# Altium integrated library USD Parts.IntLib: 139 symbols (part 1 of 3) (continued)
## AD9245BCPZ-80 (continued)
DIFF 14-Bit ADC; MPN: AD9245BCPZ-80; OC_FARNELL: 2096172; OC_NEWARK: 59K7235; PACKAGE: QFN-32; SUPPLIER: ANALOG DEVICES; Supplier 1: Digi-Key; Supplier Part Number 1: AD9245BCPZ-80-ND
footprint LFCSP-32 (32-Lead Frame Chip Scale Package 5x5 mm Body)
pins: 1 DNC, 2 CLK, 3 DNC_2, 4 PDWN, 5 (LSB)D0 (out), 6 D1 (out), 7 D2 (out), 8 D3 (out), 9 D4 (out), 10 D5 (out), 11 D6 (out), 12 D7 (out), 13 D8 (out), 14 D9 (out), 15 DGND, 16 DRVDD (power), 17 D10 (out), 18 D11 (out), 19 D12 (out), 20 D13(MSB) (out), 21 OTR, 22 MODE, 23 SENSE, 24 VREF, 25 REFB, 26 REFT, 27 AVDD_2 (power), 28 AGND_2, 29 VIN+, 30 VIN-, 31 AGND, 32 AVDD (power), 33 EPAD

## ADP151
designator U?, comment ADP151AUJZ-3.3-R7  Supplier Part Number 1: 2074871
LDO; value: ADP151AUJZ-3.3-R7; Supplier 1: Farnell; DataSheet: http://www.analog.com/media/en/technical-documentation/data-sheets/ADP151.pdf
footprint SOT23-5-TI (TPS730xx power)
pins: 1 IN (power), 2 GND (power), 3 EN (power), 4 NC (power), 5 OUT (power)

## ADP7104
designator U?, comment ADP7104ARDZ-3.3-R7  Supplier Part Number 1: ADP7104ARDZ-3.3-R7CT-ND
LDO; value: ADP7104ARDZ-3.3-R7; Supplier 1: Digi-Key; DataSheet: http://www.analog.com/media/en/technical-documentation/data-sheets/ADP7104.pdf
footprint SOIC8_EP (SOIC, 8-Leads, Body 4,90x3,90mm, Pitch 1,27mm, Thermal Pad 3,10x2,42mm, IPC Medium Density)
pins: 1 VOUT (power), 2 SENSE (power), 3 GND (power), 4 NC (power), 5 EN/UVLO (power), 6 GND (power), 7 PG (power), 8 VIN (power)

## AQY282S
designator Q?  Supplier Part Number 1: 2396110
PhotoMOS RELAY 0.5A, 60V; value: AQY282S; ComponentLink1URL: http://www.farnell.com/datasheets/1486501.pdf; Supplier 1: Farnell; ComponentLink1Description: Datasheet
footprint SOP4 (AQY28_S)
pins: 1 VDD (power), 2 GND (power), 3 IO2 (io), 4 IO1 (io)

## B3S-1000
designator D?  Supplier Part Number 1: 177807
Sealed Tactile Switch (SMT); value: B3S-1000; Supplier 1: Farnell
footprint Omron B3S1000 (SMT)
pins: 1, 2, 3, 4

## BAT64-04
designator D?  Supplier Part Number 1: 2432680
Silicon Schottky Diodes; value: BAT64-04; Supplier 1: Farnell
simulation model BAT64 (Model Description)
footprint SOT23-3
pins: 1 A1, 2 C2, 3 C1A2

## BAT64-05
designator D?
Silicon Schottky Diodes; value: BAT64-05
footprint SOT23-3
pins: 1 A1, 2 A2, 3 C

## BAT64-06
designator D?
Silicon Schottky Diodes; value: BAT64-06
footprint SOT23-3
pins: 1 K1, 2 K2, 3 AA

## BZX84-
designator D?  Supplier Part Number 1: 1902449
Zener Diode; Published: 8-Jun-2000; LatestRevisionDate: 17-Jul-2002; LatestRevisionNote: Re-released for DXP Platform.; PackageReference: DIODE-0.7; Publisher: Altium Limited; PackageDescription: Diode, Thru-Hole; 2 Leads; 0.7 in Pin Spacing; Supplier 1: Farnell; value: BZX84-
signal-integrity model D Zener
footprint SOT23-3; pin to pad 2>3
pins: 1 A, 2 K

## Capacitor
designator C?, comment 10µF
Capacitor; value: 10µF
footprint 1812
footprint Panasonic Size B (Aluminum Electrolytic Capacitor, Body 4,30x4,30x5,50mm, IPC Low Density)
footprint Panasonic Size C (Aluminum Electrolytic Capacitor, Body 5,30x5,30x5,50mm, IPC Low Density)
footprint Panasonic Size D (Aluminum Electrolytic Capacitor, Body 6,60x6,60x5,50mm, IPC Low Density)
footprint Panasonic Size E (Aluminum Electrolytic Capacitor, Body 8,30x8,30x6,50mm, IPC Low Density)
footprint 0402[1005]
footprint 0504[1210]
footprint 0603[1508]
footprint 0805[2012]
footprint 1206[3216]
pins: 1 P$1, 2 P$2

## CMP-0001-00027-1
designator MH1, comment Mounting-Hole-Altium  (no BOM)
Mounting Hole, Altium, 3.8mm pad, 3.4mm plated hole; ClassName: Mounting Hole; Publisher: Altium
footprint Mounting-Hole-Altium (Mounting Hole, Altium, 3.8mm pad, 3.4mm plated hole)
pins: 1 hidden

## Crystal 2PIN
designator OSC?
Resonator
footprint CC7V
footprint CRYSTAL_HC49-US-SM (SMD Crystal HC49/US-SM package)
footprint CRYSTAL_CMR309T (SMD Crystal CMR309T package)
pins: 1, 2

## Crystal 3PIN
designator OSC?
Resonator
footprint PRQC-TYP
pins: 1, 2, 3 (out)

## Crystal 4PIN
designator OSC?
Resonator
footprint 3.2X.2.5
footprint CRYSTAL_4-LCC (SMD Crystal 4-lead leadless package)
footprint CRYSTAL_NX2520SA (SMD Crystal 4-lead leadless package)
pins: CLK (out), EN (in), GND (power), VCC (power)

## DP83848J
designator IC?, comment DP83848J PHYTER Mini LS Single Port 10/100 Ethernet Transceiver  Supplier Part Number 1: DP83848JSQ/NOPBDKR-ND
National Semiconductor Ethernet PHY; Supplier 1: Digi-Key
footprint LLP-40
pins: 1 IOVDD33 (power), 2 TX_CLK (out), 3 TX_EN, 4 TXD_0, 5 TXD_1, 6 TXD_2, 7 TXD_3, 8 RESERVED, 9 RESERVED, 10 RESERVED, 11 RD-, 12 RD+, 13 AGND (power), 14 TD-, 15 TD+, 16 PFBIN1, 17 AGND (power), 18 AVDD33 (power), 19 PFBOUT, 20 RBIAS, 21 LED_SPEED/AN1 (out), 22 LED_LINK/AN0 (out), 23 RESET_N, 24 MDIO, 25 MDC, 26 IOVDD33 (power), 27 X2, 28 X1, 29 DGND (power), 30 PFBIN2, 31 RX_CLK (out), 32 RX_DV/MII_MODE (out), 33 CRS/CRS_DV/LED_CFG (out), 34 RX_ER/MDIX_EN (out), 35 COL/PHYAD0 (out), 36 RXD_0/PHYAD1 (out), 37 RXD_1/PHYAD2 (out), 38 RXD_2/PHYAD3 (out), 39 RXD_3/PHYAD4 (out), 40 IOGND (power), DAP GNDPAD (power)

## Inductor
designator L?, comment 10mH
Inductor; Code_IEC: 1005; Published: 8-Jun-2000; LatestRevisionDate: 29-May-2009; LatestRevisionNote: IPC-7351 Footprint Added.; PackageReference: 0402-A; Publisher: Altium Limited; PackageDescription: Chip Inductor; Code_JEITA: 0402; Value: 10mH
footprint INDC1608L (Chip Inductor, Body 1.6x0.8mm, IPC High Density)
footprint 2029 (Chip Inductor, Body 2.0x1.2mm, IPC High Density)
footprint INDC3216 (Chip Inductor, Body 3.2x1.6mm, IPC High Density)
footprint INDC4532 (Chip Inductor, Body 4.5x3.2mm, IPC High Density)
simulation model INDUCTOR (Inductor)
signal-integrity model Inductor
footprint 0603[1508]
footprint 0402[1005]
footprint WE0805
pins: 1, 2

## L78M
designator U?, comment Switch mode power supply
Resonator
footprint DPAK; pin to pad GND>4 VIN>1 VOUT>3
pins: GND (power), VIN (power), VOUT (power)

## LED
designator LED?, comment SMD LED
footprint CHIPLED_0603
footprint CHIPLED_0805
footprint CHIPLED_1206
pins: A, C

## LPC812M101FD20FP
designator U?, comment IC, 32-bit ARM Cortex-M0+ microcontroller 16 kB flash and 4 kB SRAM, SO20
MPN: LPC812M101FD20FP; OC_FARNELL: 2295531; OC_NEWARK: 69W0666; PACKAGE: SO20; SUPPLIER: NXP
footprint SOIC127P1032X265-20N
pins: 1 PIO0_17, 2 PIO0_13, 3 PIO0_12, 4 ~{RESET/PIO0_5}, 5 PIO0_4/WAKEUP, 6 SWCLK/PIO0_3, 7 SWDIO/PIO0_2/TMS, 8 PIO0_11, 9 PIO0_10, 10 PIO0_16, 11 PIO0_15, 12 PIO0_1/ACMP_I2, 13 PIO0_9/XTALOUT, 14 PIO0_8/XTALIN, 15 VDD (power), 16 VSS (power), 17 PIO0_7, 18 PIO0_6/VDDCMP, 19 PIO0_0/ACMP_I1, 20 PIO0_14

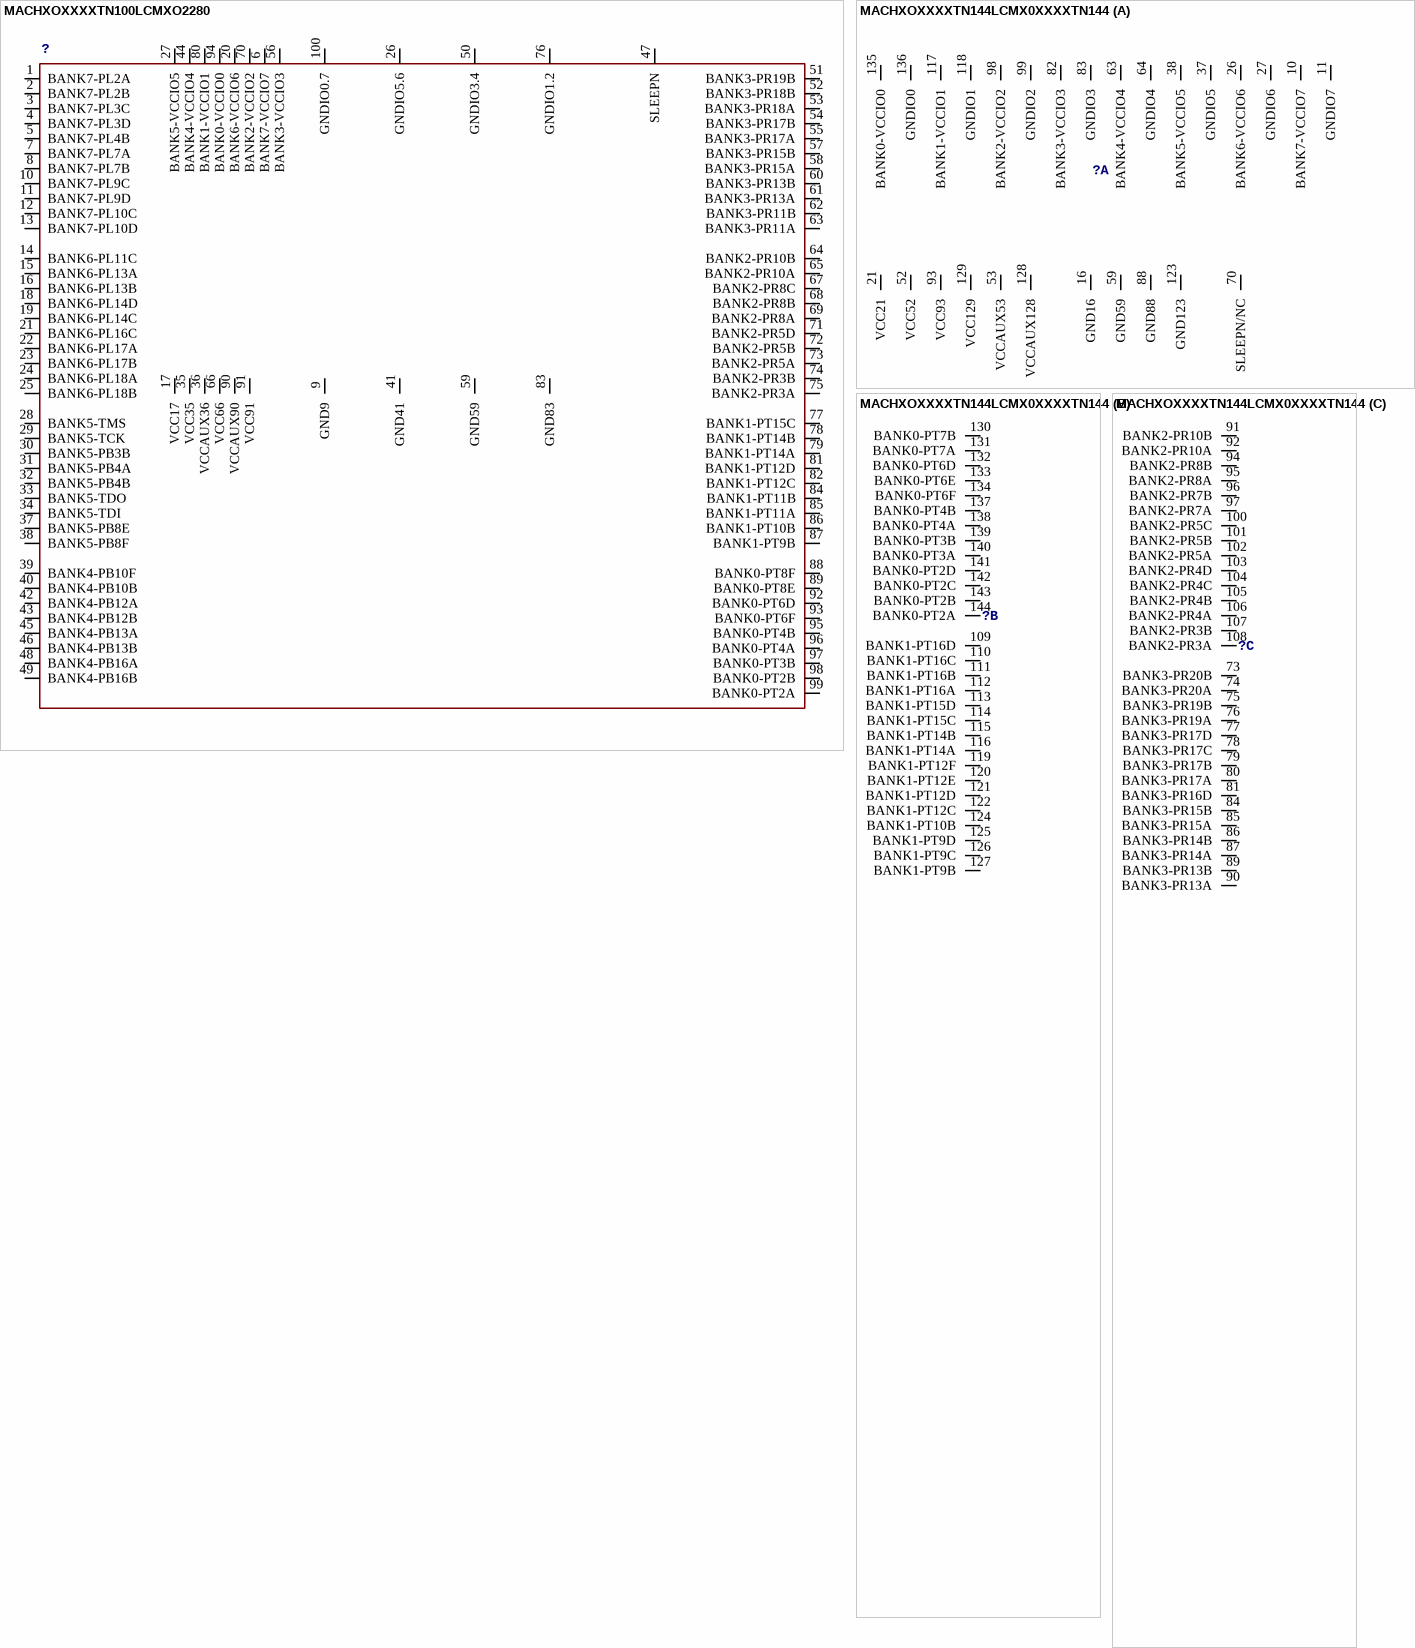
[diagram p3: symbols MACHXOXXXXTN100LCMXO2280 to MACHXOXXXXTN144LCMX0XXXXTN144]

## MACHXOXXXXTN100LCMXO2280
designator ?
footprint TQFP100
pins: 1 BANK7-PL2A, 2 BANK7-PL2B, 3 BANK7-PL3C, 4 BANK7-PL3D, 5 BANK7-PL4B, 6 BANK7-VCCIO7 (power), 7 BANK7-PL7A, 8 BANK7-PL7B, 9 GND9 (power), 10 BANK7-PL9C, 11 BANK7-PL9D, 12 BANK7-PL10C, 13 BANK7-PL10D, 14 BANK6-PL11C, 15 BANK6-PL13A, 16 BANK6-PL13B, 17 VCC17 (power), 18 BANK6-PL14D, 19 BANK6-PL14C, 20 BANK6-VCCIO6 (power), 21 BANK6-PL16C, 22 BANK6-PL17A, 23 BANK6-PL17B, 24 BANK6-PL18A, 25 BANK6-PL18B, 26 GNDIO5.6 (power), 27 BANK5-VCCIO5 (power), 28 BANK5-TMS, 29 BANK5-TCK, 30 BANK5-PB3B, 31 BANK5-PB4A, 32 BANK5-PB4B, 33 BANK5-TDO, 34 BANK5-TDI, 35 VCC35 (power), 36 VCCAUX36 (power), 37 BANK5-PB8E, 38 BANK5-PB8F, 39 BANK4-PB10F, 40 BANK4-PB10B, 41 GND41 (power), 42 BANK4-PB12A, 43 BANK4-PB12B, 44 BANK4-VCCIO4 (power), 45 BANK4-PB13A, 46 BANK4-PB13B, 47 SLEEPN, 48 BANK4-PB16A, 49 BANK4-PB16B, 50 GNDIO3.4 (power), 51 BANK3-PR19B, 52 BANK3-PR18B, 53 BANK3-PR18A, 54 BANK3-PR17B, 55 BANK3-PR17A, 56 BANK3-VCCIO3 (power), 57 BANK3-PR15B, 58 BANK3-PR15A, 59 GND59 (power), 60 BANK3-PR13B, 61 BANK3-PR13A, 62 BANK3-PR11B, 63 BANK3-PR11A, 64 BANK2-PR10B, 65 BANK2-PR10A, 66 VCC66 (power), 67 BANK2-PR8C, 68 BANK2-PR8B, 69 BANK2-PR8A, 70 BANK2-VCCIO2 (power), 71 BANK2-PR5D, 72 BANK2-PR5B, 73 BANK2-PR5A, 74 BANK2-PR3B, 75 BANK2-PR3A, 76 GNDIO1.2 (power), 77 BANK1-PT15C, 78 BANK1-PT14B, 79 BANK1-PT14A, 80 BANK1-VCCIO1 (power), 81 BANK1-PT12D, 82 BANK1-PT12C, 83 GND83 (power), 84 BANK1-PT11B, 85 BANK1-PT11A, 86 BANK1-PT10B, 87 BANK1-PT9B, 88 BANK0-PT8F, 89 BANK0-PT8E, 90 VCCAUX90 (power), 91 VCC91 (power), 92 BANK0-PT6D, 93 BANK0-PT6F, 94 BANK0-VCCIO0 (power), 95 BANK0-PT4B, 96 BANK0-PT4A, 97 BANK0-PT3B, 98 BANK0-PT2B, 99 BANK0-PT2A, 100 GNDIO0.7 (power)

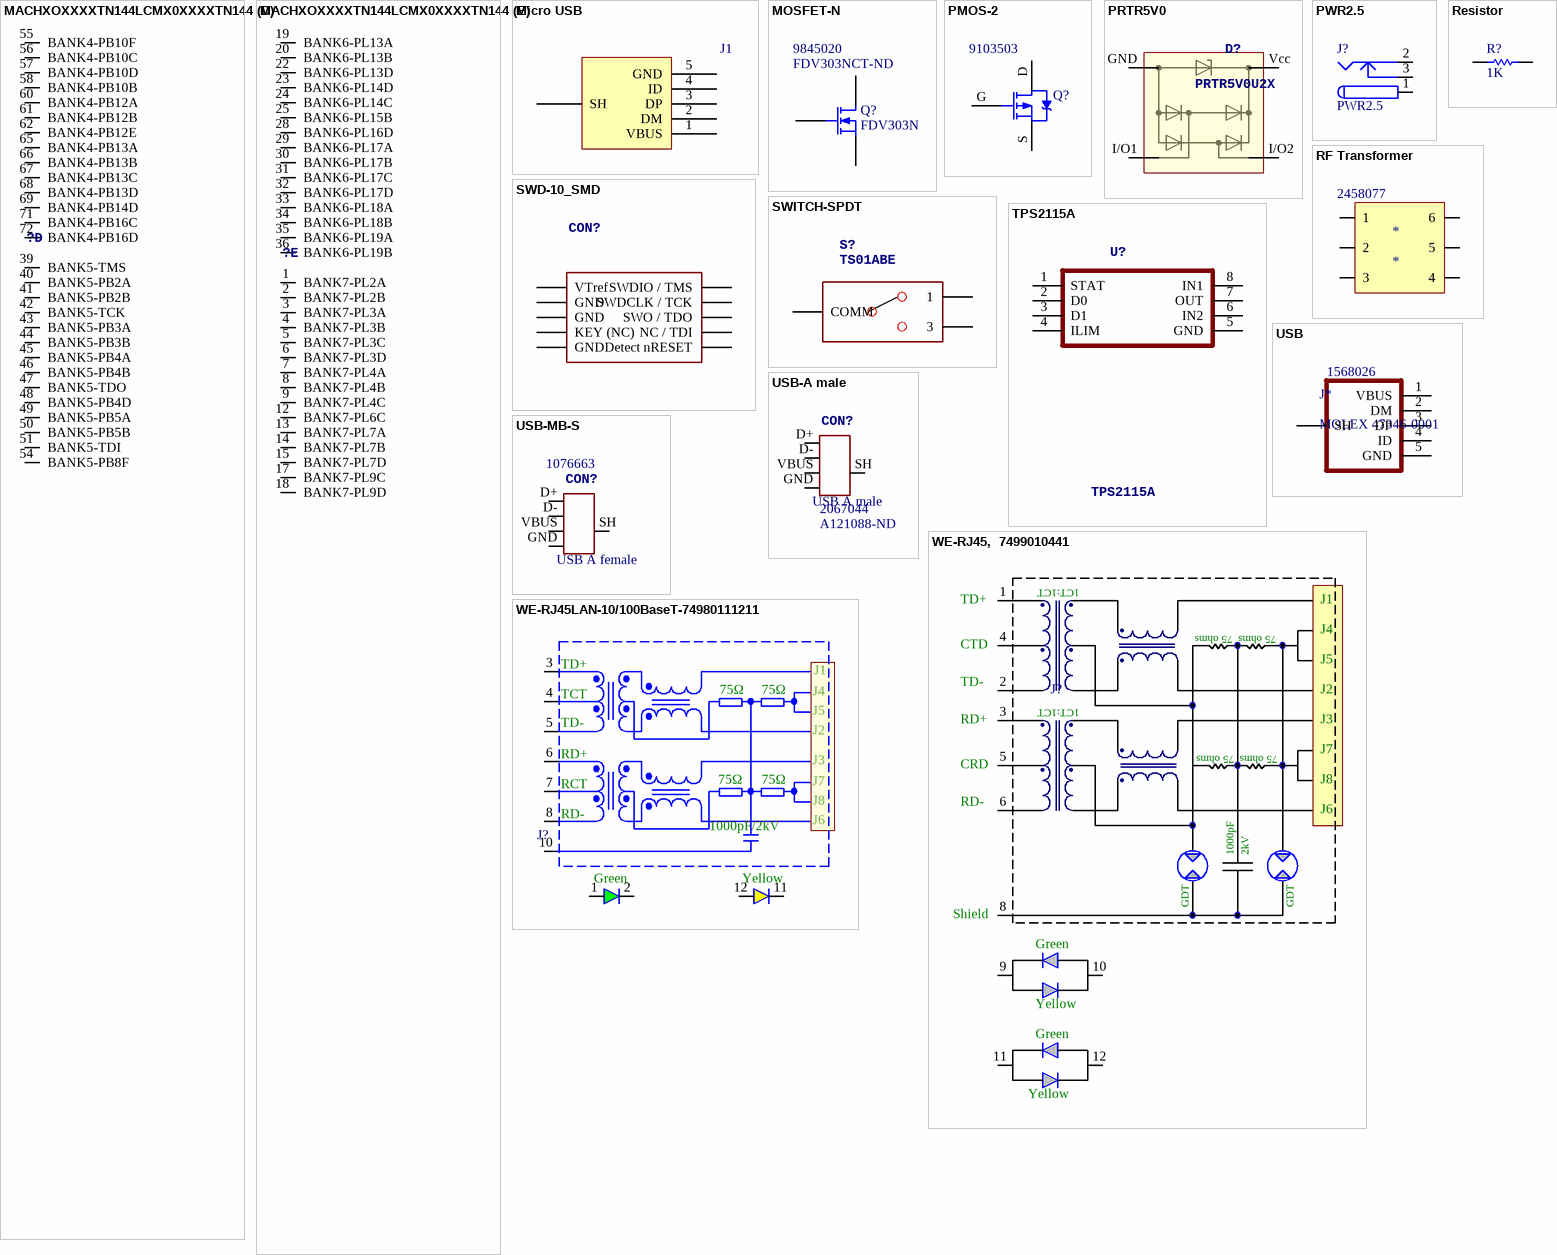
[diagram p4: symbols MACHXOXXXXTN144LCMX0XXXXTN144 to WE-RJ45LAN-10/100BaseT-74980111211]

## MACHXOXXXXTN144LCMX0XXXXTN144
designator ?
footprint TQFP144
footprint LQFP144 (plastic low profile quad flat package, 144 leads, body 20x20x1.4mm)
part A pins: 10 BANK7-VCCIO7 (power), 11 GNDIO7 (power), 16 GND16 (power), 21 VCC21 (power), 26 BANK6-VCCIO6 (power), 27 GNDIO6 (power), 37 GNDIO5 (power), 38 BANK5-VCCIO5 (power), 52 VCC52 (power), 53 VCCAUX53 (power), 59 GND59 (power), 63 BANK4-VCCIO4 (power), 64 GNDIO4 (power), 70 SLEEPN/NC, 82 BANK3-VCCIO3 (power), 83 GNDIO3 (power), 88 GND88 (power), 93 VCC93 (power), 98 BANK2-VCCIO2 (power), 99 GNDIO2 (power), 117 BANK1-VCCIO1 (power), 118 GNDIO1 (power), 123 GND123 (power), 128 VCCAUX128 (power), 129 VCC129 (power), 135 BANK0-VCCIO0 (power), 136 GNDIO0 (power)
part B pins: 109 BANK1-PT16D, 110 BANK1-PT16C, 111 BANK1-PT16B, 112 BANK1-PT16A, 113 BANK1-PT15D, 114 BANK1-PT15C, 115 BANK1-PT14B, 116 BANK1-PT14A, 119 BANK1-PT12F, 120 BANK1-PT12E, 121 BANK1-PT12D, 122 BANK1-PT12C, 124 BANK1-PT10B, 125 BANK1-PT9D, 126 BANK1-PT9C, 127 BANK1-PT9B, 130 BANK0-PT7B, 131 BANK0-PT7A, 132 BANK0-PT6D, 133 BANK0-PT6E, 134 BANK0-PT6F, 137 BANK0-PT4B, 138 BANK0-PT4A, 139 BANK0-PT3B, 140 BANK0-PT3A, 141 BANK0-PT2D, 142 BANK0-PT2C, 143 BANK0-PT2B, 144 BANK0-PT2A
part C pins: 73 BANK3-PR20B, 74 BANK3-PR20A, 75 BANK3-PR19B, 76 BANK3-PR19A, 77 BANK3-PR17D, 78 BANK3-PR17C, 79 BANK3-PR17B, 80 BANK3-PR17A, 81 BANK3-PR16D, 84 BANK3-PR15B, 85 BANK3-PR15A, 86 BANK3-PR14B, 87 BANK3-PR14A, 89 BANK3-PR13B, 90 BANK3-PR13A, 91 BANK2-PR10B, 92 BANK2-PR10A, 94 BANK2-PR8B, 95 BANK2-PR8A, 96 BANK2-PR7B, 97 BANK2-PR7A, 100 BANK2-PR5C, 101 BANK2-PR5B, 102 BANK2-PR5A, 103 BANK2-PR4D, 104 BANK2-PR4C, 105 BANK2-PR4B, 106 BANK2-PR4A, 107 BANK2-PR3B, 108 BANK2-PR3A
part D pins: 39 BANK5-TMS, 40 BANK5-PB2A, 41 BANK5-PB2B, 42 BANK5-TCK, 43 BANK5-PB3A, 44 BANK5-PB3B, 45 BANK5-PB4A, 46 BANK5-PB4B, 47 BANK5-TDO, 48 BANK5-PB4D, 49 BANK5-PB5A, 50 BANK5-PB5B, 51 BANK5-TDI, 54 BANK5-PB8F, 55 BANK4-PB10F, 56 BANK4-PB10C, 57 BANK4-PB10D, 58 BANK4-PB10B, 60 BANK4-PB12A, 61 BANK4-PB12B, 62 BANK4-PB12E, 65 BANK4-PB13A, 66 BANK4-PB13B, 67 BANK4-PB13C, 68 BANK4-PB13D, 69 BANK4-PB14D, 71 BANK4-PB16C, 72 BANK4-PB16D
part E pins: 1 BANK7-PL2A, 2 BANK7-PL2B, 3 BANK7-PL3A, 4 BANK7-PL3B, 5 BANK7-PL3C, 6 BANK7-PL3D, 7 BANK7-PL4A, 8 BANK7-PL4B, 9 BANK7-PL4C, 12 BANK7-PL6C, 13 BANK7-PL7A, 14 BANK7-PL7B, 15 BANK7-PL7D, 17 BANK7-PL9C, 18 BANK7-PL9D, 19 BANK6-PL13A, 20 BANK6-PL13B, 22 BANK6-PL13D, 23 BANK6-PL14D, 24 BANK6-PL14C, 25 BANK6-PL15B, 28 BANK6-PL16D, 29 BANK6-PL17A, 30 BANK6-PL17B, 31 BANK6-PL17C, 32 BANK6-PL17D, 33 BANK6-PL18A, 34 BANK6-PL18B, 35 BANK6-PL19A, 36 BANK6-PL19B

## Micro USB
designator J1, comment MICRO USB 2.0 BUCHSE, TYP B, SMD  (value not drawn)
Micro USB Jack B; Reseller: Farnell; value: MICRO USB 2.0 BUCHSE, TYP B, SMD; DataSheet: http://www.farnell.com/datasheets/1681853.pdf; Supplier Part Number 1: 47346-0001; OC_FARNELL: 1568026; SUPPLIER: MOLEX
footprint USB Micro
footprint USB micro holes
pins: 1 VBUS, 2 DM, 3 DP, 4 ID, 5 GND, SH

## MOSFET-N
designator Q?, comment FDV303N  Supplier Part Number 1: FDV303NCT-ND  Supplier Part Number 2: 9845020
N-Channel MOSFET; Published: 8-Jun-2000; LatestRevisionDate: 17-Jul-2002; LatestRevisionNote: Re-released for DXP Platform.; PackageVersion: 1995/1996; PackageReference: E3; Publisher: Altium Limited; PackageDescription: TO, Flat Index; 3 In-Line, Axial Leads; Body Dia. 4.6mm; Lead Dia. 0.5 mm (max); Supplier 1: Digi-Key; Supplier 2: Farnell; value: FDV303N
simulation model NMOS (MOSFET-N)
footprint SOT23127P600-8N
pins: 1 D, 2 G, 3 S

## PMOS-2
designator Q?  Supplier Part Number 1: 9103503
P-Channel Power MOSFET; Note: Pin 4 not drawn and electrically connected to Pin 2.; Published: 8-Jun-2000; LatestRevisionDate: 17-Jul-2002; LatestRevisionNote: Re-released for DXP Platform.; DatasheetVersion: PD-9.390D; PackageVersion: Feb-1997; PackageReference: TO-220AB; Publisher: Altium Limited; PackageDescription: TO, Thru-Hole, Vertical, Heatsink Mounted; 3 In-Line Leads; Pitch 2.54 mm; ComponentLink1Description: Manufacturer Link; ComponentLink1URL: http://www.irf.com/; Supplier 1: Farnell
footprint SOT23-3; pin to pad D>3 G>1 S>2
pins: D, G, S

## PRTR5V0
designator D?, comment PRTR5V0U2X
rail-to-rail ESD protection diode; value: PRTR5V0U2X
footprint SOT143-B (SOT143, 4-Leads, Body 2,90x2,30mm, Pitch 1,90mm, IPC Medium Density); pin to pad GND>1 I/O1>2 I/O2>3 Vcc>4
pins: GND 1, I/O1 2, I/O2 3, Vcc 3

## PWR2.5
designator J?
WR-DC DC Power Jack Right Angled (6.4); Published: 17-Dec-2003; DatasheetDocument: 09-May-2002; Publisher: Altium Limited; ComponentLink1Description: Manufacturer Link; ComponentLink1URL: http://katalog.we-online.de/em/datasheet/6941xx301002.pdf
signal-integrity model Connector
footprint WR-DC DC Power Jack (DC Power Jack, 2.5mm, KLD Series, PCB Mount)
pins: 1 (power), 1A (power), 1B (power), 2 (power), 2A (power), 2B (power), 3 (power), 3A (power), 3B (power)

## Resistor
designator R?, comment 1K
Resistor; Published: 8-Jun-2000; LatestRevisionDate: 17-Jul-2002; LatestRevisionNote: Re-released for DXP Platform.; PackageReference: AXIAL-0.3; Publisher: Altium Limited; PackageDescription: Axial Device, Thru-Hole; 2 Leads; 0.3 in Pin Spacing; Value: 1K
simulation model RESISTOR (Resistor)
signal-integrity model Res
footprint 1210
footprint 1812
footprint 0402[1005]
footprint 0504[1210]
footprint 0603[1508]
footprint 0805[2012]
footprint 1206[3216]
footprint RES1405[3614 Metric] (MELF Resistor, 2-Leads, Body 3,50x1,40mm, IPC Medium Density)
footprint 2010[5.0x2.5 metric]
pins: 1, 2

## RF Transformer
designator *  Supplier Part Number 1: 2458077
Supplier 1: Farnell
footprint PWB-X-
pins: 1, 2, 3, 4, 5, 6

## SWD-10_SMD
designator CON?
footprint SWD-10-SMD
pins: GND, GND, GNDDetect, KEY KEY (NC), nRESET, TCK SWDCLK / TCK, TDI NC / TDI, TDO SWO / TDO, TMS SWDIO / TMS, VTref

## SWITCH-SPDT
designator S?, comment TS01ABE
SWITCH; value: TS01ABE; DataSheet: http://www.farnell.com/datasheets/1839865.pdf; Supplier 1: Farnell; Supplier Part Number 1: 2435185
footprint SPDT Slider
pins: 1 (power), 2 COMM (power), 3 (power)

## TPS2115A
designator U?
autoswitching power mux; Supplier 1: Farnell; Supplier Part Number 1: 2460006
footprint TSSOP-8 (TSOP, 8-Leads, Body 3,00x4,40mm, Pitch 0,65mm, IPC Medium Density)
pins: 1 STAT, 2 D0, 3 D1, 4 ILIM, 5 GND, 6 IN2, 7 OUT, 8 IN1

## USB
designator J*, comment MOLEX 47346-0001  Supplier Part Number 1: 1568026
MICRO USB 2.0 BUCHSE, TYP A, SMD; Supplier 1: Farnell; value: MOLEX 47346-0001
footprint USB Micro
footprint USB micro holes
pins: 1 VBUS, 2 DM, 3 DP, 4 ID, 5 GND, SH

## USB-A male
designator CON?, comment USB A male  Supplier Part Number 1: A121088-ND  Supplier Part Number 2: 2067044  (net tie)
MICRO USB 2.0 Stecker, TYP A, THD; Supplier 1: Digi-Key; Supplier 2: Farnell
pins: D+, D-, GND, SH, VBUS (power)

## USB-MB-S
designator CON?, comment USB A female  Supplier Part Number 1: 1076663
Supplier 1: Farnell
footprint USB A female
pins: D+, D-, GND, SH, VBUS (power)

## WE-RJ45,  7499010441
designator J?, comment 360-400 V (DC)  (value not drawn)
LAN Transformer WE-RJ45, with Surge Protection; PartNo: 7499010441; Manufacturer: W黵th Elektronik eiSos GmbH; (Input Voltage) Ui: 360-400 V (DC); ComponentLink1Description: Manufacturer; ComponentLink1URL: http://www.we-online.de; Created by: Otto Christin; Created Date: NOV 2013; ComponentLink2Description: Datasheet; ComponentLink2URL: http://www.we-online.de/katalog/media/pdf/7499010441.pdf
footprint WE-RJ45 LAN (with Surge Protection, RJ45 LAN CONNECTOR 16.04X 21.30 MM)
pins: 1 TD+, 2 TD-, 3 RD+, 4 CTD, 5 CRD, 6 RD-, 8 Shield, 9, 10, 11, 12
text: 1CT:1CT; J1; 75 ohms; J4; J5; J2; J3; J7; J8; J6; 1000pF; 2kV; GDT; Green; Yellow

## WE-RJ45LAN-10/100BaseT-74980111211
designator J?
Integrated RJ45 Transformer WE-RJ45LAN; PartNo: 74980111211; Manufacturer: Wurth Elektronik; E-mail: libraries@we-online.com; ComponentLink1Description: Manufacturer; ComponentLink1URL: http://www.we-online.de; Created by: Karrer Zheng; Created Date: Feb 2015; ComponentLink2Description: Datasheet; ComponentLink2URL: http://www.we-online.de/katalog/media/pdf/74980111211.pdf
footprint 74980111211 (10/100Base-T, SMD, 1x1, Tab up, with shield tabs, LED L-R yellow-green; ETR)
pins: 1 +, 2 -, 3 RD+, 4 RCT, 5 RD-, 6 TD+, 7 TCT, 8 TD-, 10 SH, 11 -, 12 +
text: J1; 75Ω; J4; J5; J2; J3; J7; J8; J6; 1000pF/2kV; Green; Yellow


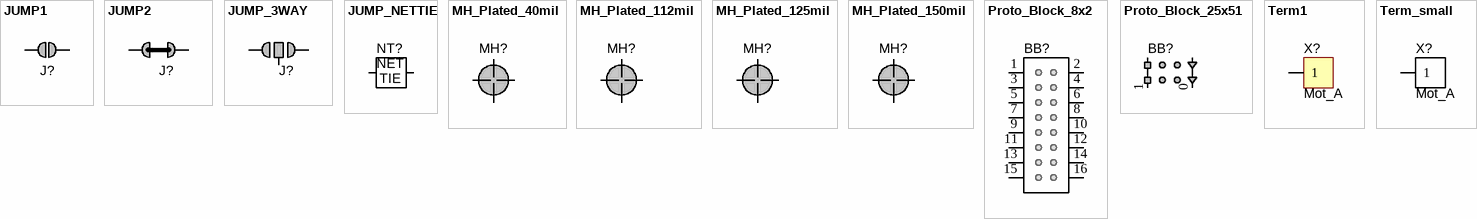
[diagram p5: symbols JUMP1 to Term_small]

## JUMP1
designator J?, comment Jumper  (value not drawn)  (no BOM)
SMD jumper
footprint JUMP1 (SMT Battery jumper pads)
pins: 1, 2

## JUMP2
designator J?, comment Jumper  (value not drawn)  (net tie, no BOM)
SMD jumper
footprint JUMP2 (SMT Battery jumper pads)
pins: 1, 2

## JUMP_3WAY
designator J?, comment Jumper  (value not drawn)  (no BOM)
SMD jumper
footprint Jump_3Way (SMT Battery jumper pads)
pins: 1, 2, 3

## JUMP_NETTIE
designator NT?, comment Net Tie  (value not drawn)  (net tie, no BOM)
footprint NetTie_Internal1_24mil
footprint NetTie_Internal2_24mil
footprint NetTie_External_24mil
pins: 1, 2
text: NET; TIE

## MH_Plated_40mil
designator MH?  (value not drawn)  (no BOM)
footprint MH_PLATED_40mil ID x 100mil OD (Plated Mounting hole, general purpose)
pins: MH

## MH_Plated_112mil
designator MH?  (value not drawn)  (no BOM)
footprint MH_PLATED_112 ID x 260mil OD (Plated Mounting hole, accepts 4-xx machine screw)
pins: MH

## MH_Plated_125mil
designator MH?  (value not drawn)  (no BOM)
Rule: UNIONINDEX{}0[]SOLDERMASKEXPANSIONMODE{}None[]PASTEMASKEXPANSIONMODE{}None[]RULEKIND{}PlaneConnect[]NETSCOPE{}AnyNet[]LAYERKIND{}SameLayer[]NAME{}Schematic Power Plane Connect Style[]PLANECONNECTSTYLE{}Direct[]RELIEFEXPANSION{}15mil[]RELIEFENTRIES{}2[]RELIEFCONDUCTORWIDTH{}12mil[]RELIEFAIRGAP{}10mil[]UNIT{}Imperial[]PcbType{}ProtelPcb
footprint MH_PLATED_125 ID x 260mil OD (Plated Mounting Hole)
pins: MH

## MH_Plated_150mil
designator MH?  (value not drawn)  (no BOM)
footprint MH_PLATED_150ID x 220mil OD (Plated Mounting Hole, Accepts 4-xx machine screw)
pins: MH

## Proto_Block_8x2
designator BB?  (value not drawn)  (no BOM)
DAQ breakout section
footprint Breakout_8x2 (Small DAQ breakout for hookup to breadboard section)
pins: 1 AI2, 2 AI3, 3 AI10, 4 AI11, 5 GND, 6 GND, 7 AO0, 8 AO1, 9 P0.7, 10 P1.7, 11 P2.0, 12 P2.1, 13 P2.2, 14 P2.3, 15 P2.4, 16 P2.5

## Proto_Block_25x51
designator BB?  (value not drawn)  (no BOM)
footprint BreadBoard_25x51 (Small 1"x2" breadboard section)
pins: 0, 1

## Term1
designator X?, comment Mot_A  (no BOM)
footprint THP_D38_T75_B125 (Thru-Hole Pad with 75mil top and 125mil bottom annular rings)
pins: 1

## Term_small
designator X?, comment Mot_A  (no BOM)
footprint THP_D38_T75_B75 (Thru-Hole Pad with 75mil top and 75mil bottom annular rings)
pins: 1


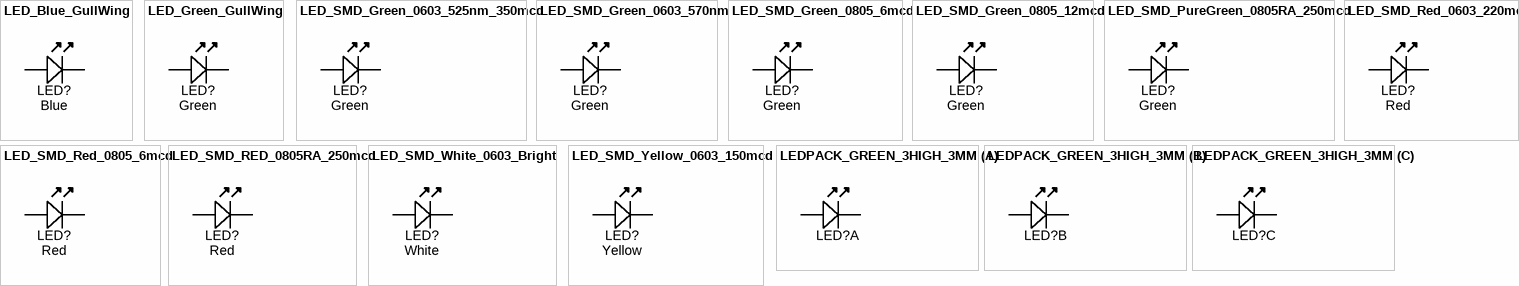
[diagram p6: symbols LED_Blue_GullWing to LEDPACK_GREEN_3HIGH_3MM]

## LED_Blue_GullWing
designator LED?  Color: Blue  (hidden comment: *)
LED, Gull-wing SMD, High-intensity blue; Manufacturer 1: Ligitek; Manufacturer Part Number 1: LDBK9033/TR1; Ratings: 350 mcd; SCDType: source; Package / Case: 4.6mm Gull-Wing
footprint LED_GULL1
pins: A, K

## LED_Green_GullWing
designator LED?  Color: Green  (hidden comment: *)
LED Gull-wing SMD High-intensity Green 450mcd 574nm; Manufacturer 1: Ligitek; Manufacturer Part Number 1: L8UG9033/TR1; Ratings: 450 mcd; 574 nm; Material: AlGaInP; SCDType: source; Package / Case: 4.6mm Gull-Wing
footprint LED_GULL1
pins: A, K

## LED_SMD_Green_0603_525nm_350mcd
designator LED?, comment Green
LED 0603 SMD Green 525nm 350mcd 20mA; Manufacturer 1: Kingbright; Manufacturer Part Number 1: APT1608ZGCK; Material: InGaN; Ratings: 200mcd min; 350 mcd typ @ 20mA; Voltage - Forward (Vf) @ 10mA: 3.1V; Viewing Angle: 120°; Lens Style/Size: Rectangle with Flat Top, 1.2mm x 0.8mm; Voltage - Forward (Vf) @ 20mA: 3.3V; SCDType: source; Package / Case: 0603 (1608 metric); Color: Green; Current - Test: 20mA; Manufacturer 2: Kingbright Company LLC; Manufacturer Part Number 2: APT1608-WAP24; Supplier 1: Mouser; Supplier Part Number 1: 604-APT1608ZGCK; ComponentLink1URL: http://www.mouser.com/ds/2/216/APT1608ZGCK-262051.pdf; ComponentLink1Description: http://www.mouser.com/ds/2/216/APT1608ZGCK-262051.pdf; ComponentLink2Description: APT1608-WAP24 Datasheet; ComponentLink2URL: \\SVFI2\PBLShare\Eng\Electrical Engineering\Hardware\Altium\Libraries and Templates\Unreleased Components\Part Number Request 2013-10-02\APT1608-WAP24(Ver.1B).pdf
footprint LED-0603-GREEN
pins: A, K

## LED_SMD_Green_0603_570nm
designator LED?, comment Green
LED 0603 SMD Green 570nm 50mcd 20mA; Manufacturer 1: Kingbright Company LLC; Manufacturer Part Number 1: APT1608CGCK; Material: AlGaInP; Ratings: 20mcd min; 50 mcd typ; 570 nm; Voltage - Forward (Vf) Typ: 2.1V; Viewing Angle: 120°; Lens Style/Size: Rectangle with Flat Top, 1.1mm x 0.8mm; Voltage - Forward (Vf) @ 10mA: 2.0V; SCDType: source; Wavelength - Peak: 574nm; Lens Type: Clear; Package / Case: 0603 (1608 metric); Color: Green; Current - Test: 20mA; Supplier 1: Digi-Key; Supplier Part Number 1: 754-1116-1-ND; RoHS 1: RoHS Compliant; Wavelength - Dominant: 570nm; ComponentLink1URL: http://www.us.kingbright.com/images/catalog/SPEC/APT1608CGCK.pdf; ComponentLink1Description: http://www.us.kingbright.com/images/catalog/SPEC/APT1608CGCK.pdf
footprint LED-0603-GREEN
pins: A, K

## LED_SMD_Green_0805_6mcd
designator LED?  Color: Green
LED, 0805 SMD, Green; Manufacturer 1: LITE-ON; Manufacturer Part Number 1: LTST-C171GKT; Material: GaP; Ratings: 6 mcd; 569 nm; SCDType: source; Package / Case: 0805; Supplier 1: Digi-Key; Supplier Part Number 1: 160-1423-1-ND; Value: Green
footprint LED-0805-K
pins: A, K

## LED_SMD_Green_0805_12mcd
designator LED?, comment Green
LED 0805 SMD Green 12mcd 569nm; Manufacturer 1: LITE-ON; Manufacturer Part Number 1: LTST-C171GKT; Material: GaP; Ratings: 12 mcd; 569 nm; SCDType: source; Package / Case: 0805; Supplier 1: Digi-Key; Supplier Part Number 1: 160-1423-1-ND; Value: Green; Color: Green
footprint LED-0805-K
pins: A, K

## LED_SMD_PureGreen_0805RA_250mcd
designator LED?, comment Green
LED 0805 SIDELED SMD Green 250mcd 525nm; Manufacturer 1: Kingbright Corp; Manufacturer Part Number 1: APA2106ZGC; Material: InGaN; Ratings: 250 mcd; 525 nm; SCDType: source; Package / Case: 2.1x0.6x1.0mm SIDELED; Value: Green; Supplier 1: Digi-Key; Supplier Part Number 1: 754-1062-1-ND; Color: Green
footprint LED-0805S-SIDELED-2.1X0.6X1.0 (Lite-On Inc PLCC Side LED)
pins: A, K

## LED_SMD_Red_0603_220mcd
designator LED?, comment Red
LED 0603 SMD Hyper Red 630nm 220mcd 20mA; Manufacturer 1: Kingbright Company LLC; Manufacturer Part Number 1: APT1608SURCK; Material: AlGaInP on GaAs; Ratings: 220 mcd; 630 nm; Voltage - Forward (Vf) Typ: 1.95V; Voltage - Forward (Vf) @ 10mA: 1.9V; SCDType: source; Package / Case: 0603 (1608 metric); Supplier 1: Digi-Key; Supplier Part Number 1: 754-1123-1-ND; ComponentLink1URL: http://www.us.kingbright.com/images/catalog/SPEC/APT1608SURCK.pdf; ComponentLink1Description: http://www.us.kingbright.com/images/catalog/SPEC/APT1608SURCK.pdf
footprint LED-0603-RED
pins: A, K

## LED_SMD_Red_0805_6mcd
designator LED?  Color: Red
LED 0805 SMD Red 6mcd 621nm; Manufacturer 1: Lite-On Inc; Manufacturer Part Number 1: LTST-C171EKT; Material: GaAsP on GaP; Ratings: 6 mcd; 621 nm; SCDType: source; Package / Case: 0805; Supplier 1: Digi-Key; Supplier Part Number 1: 160-1422-1-ND; Value: Red
footprint LED-0805-K
pins: A, K

## LED_SMD_RED_0805RA_250mcd
designator LED?, comment Red
LED SMD SIDELED Red 630nm 250mcd 0805; Manufacturer 1: Kingbright Corp; Manufacturer Part Number 1: APA2106SURCK; Material: Al-InGaN; Ratings: 250 mcd; 630 nm; SCDType: spec; Package / Case: 2.1x0.6x1.0mm SIDELED; Value: Red; Supplier 1: Digi-Key; Supplier Part Number 1: 754-1060-1-ND; Color: Red
footprint LED-0805S-SIDELED-2.1X0.6X1.0 (Lite-On Inc PLCC Side LED)
pins: A, K

## LED_SMD_White_0603_Bright
designator LED?, comment White
LED 0603 SMD Bright White 8700K; Manufacturer 1: Lite-On Inc; Manufacturer Part Number 1: LTW-C193TS5; Material: InGaN; Ratings: Ultra Bright; 8700K; Millicandela Rating: 230mcd; Voltage - Forward (Vf) Typ: 3.3V; Viewing Angle: 120°; Lens Type: Clear, Tinted; Lens Style/Size: Rectangle with Flat Top, 0.8mm x 1.1mm; Voltage - Forward (Vf) @ 10mA: 3.0V; SCDType: source; Package / Case: 0603 (1608 metric); Supplier 1: Digi-Key; Supplier Part Number 1: 160-1721-1-ND; Supplier 2: Digi-Key; Supplier Part Number 2: APT1608QWF/D-ND; Manufacturer 2: Kingbright Corp; Manufacturer Part Number 2: APT1608QWF/D; Color: White; Size / Dimension: 1.60mm L x 0.80mm W; Mounting Type: Surface Mount; Luminous Flux @ Current - Test: -; ComponentLink2URL: http://www.kingbrightusa.com/images/catalog/SPEC/APT1608QWF-D.pdf; ComponentLink2Description: http://www.kingbrightusa.com/images/catalog/SPEC/APT1608QWF-D.pdf; ComponentLink1URL: http://media.digikey.com/pdf/Data%20Sheets/Lite-On%20PDFs/LTW-C193TS5.pdf; ComponentLink1Description: http://media.digikey.com/pdf/Data%20Sheets/Lite-On%20PDFs/LTW-C193TS5.pdf
footprint LED-0603-WHITE
pins: A, K

## LED_SMD_Yellow_0603_150mcd
designator LED?, comment Yellow
LED 0603 SMD Yellow 590nm 150mcd 20mA; Manufacturer 1: Kingbright Company LLC; Manufacturer Part Number 1: APT1608SYCK; Material: AlGaInP on GaAs; Ratings: 150 mcd; 590 nm; Voltage - Forward (Vf) Typ: 2V; Voltage - Forward (Vf) @ 10mA: 1.95V; SCDType: source; Package / Case: 0603 (1608 metric); Supplier 1: Digi-Key; Supplier Part Number 1: 754-1124-1-ND; ComponentLink1URL: http://www.us.kingbright.com/images/catalog/SPEC/APT1608SYCK.pdf; ComponentLink1Description: http://www.us.kingbright.com/images/catalog/SPEC/APT1608SYCK.pdf
footprint LED-0603-YELLOW
pins: A, K

## LEDPACK_GREEN_3HIGH_3MM
designator LED?, comment Power status  (value not drawn)
LED array PCB mount 3-high 3mm green; Manufacturer 1: Dialight; Manufacturer Part Number 1: 564-0100-222F; Ratings: 10mcd; 20mA; Voltge Rating: 2.1V; Wavelength - Peak: 585nm; Viewing Angle: 60°; SCDType: spec; Package / Case: 3-high LED bar; Supplier 1: Digi-Key; Supplier Part Number 1: 350-1752-ND; ComponentLink2URL: http://www.dialight.com/Assets/Brochures_And_Catalogs/Indication/564-0x00-xxx.pdf; ComponentLink2Description: http://www.dialight.com/Assets/Brochures_And_Catalogs/Indication/564-0x00-xxx.pdf; Color: Green; Value: Green
footprint LED_3-HIGH_3MM (LED Circuit Board Indicator Tri-Level)
part A pins: A1, K1
part B pins: A2, K2
part C pins: A3, K3


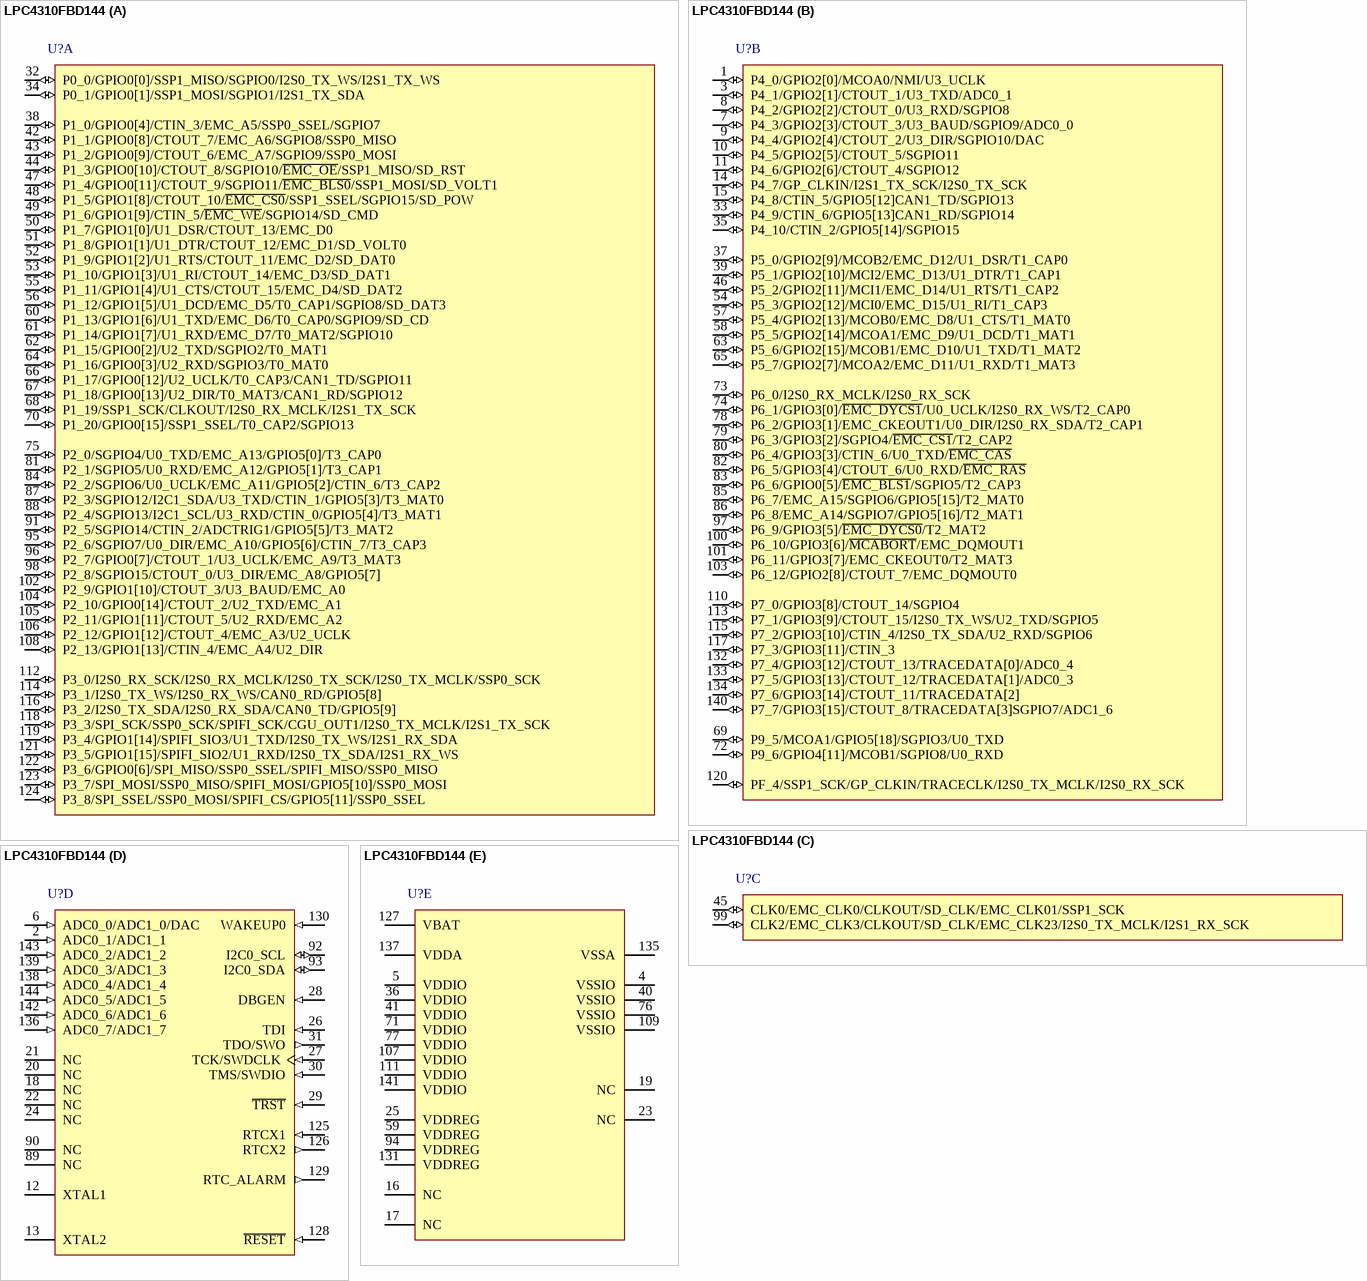
[diagram p7: symbol LPC4310FBD144]